# Altium footprint library My_Intlib.PcbLib: 224 footprints (part 9 of 14)
Each footprint in its own frame and in the unit in brackets; x right, y up, seen from the top. Pads: shape width x height; smd on the part's side, far side on the other; paste and mask are expansions set on the pad; w line width, h text height; cw(c..) or ccw(c..) is an arc to the next point about the centre after c.
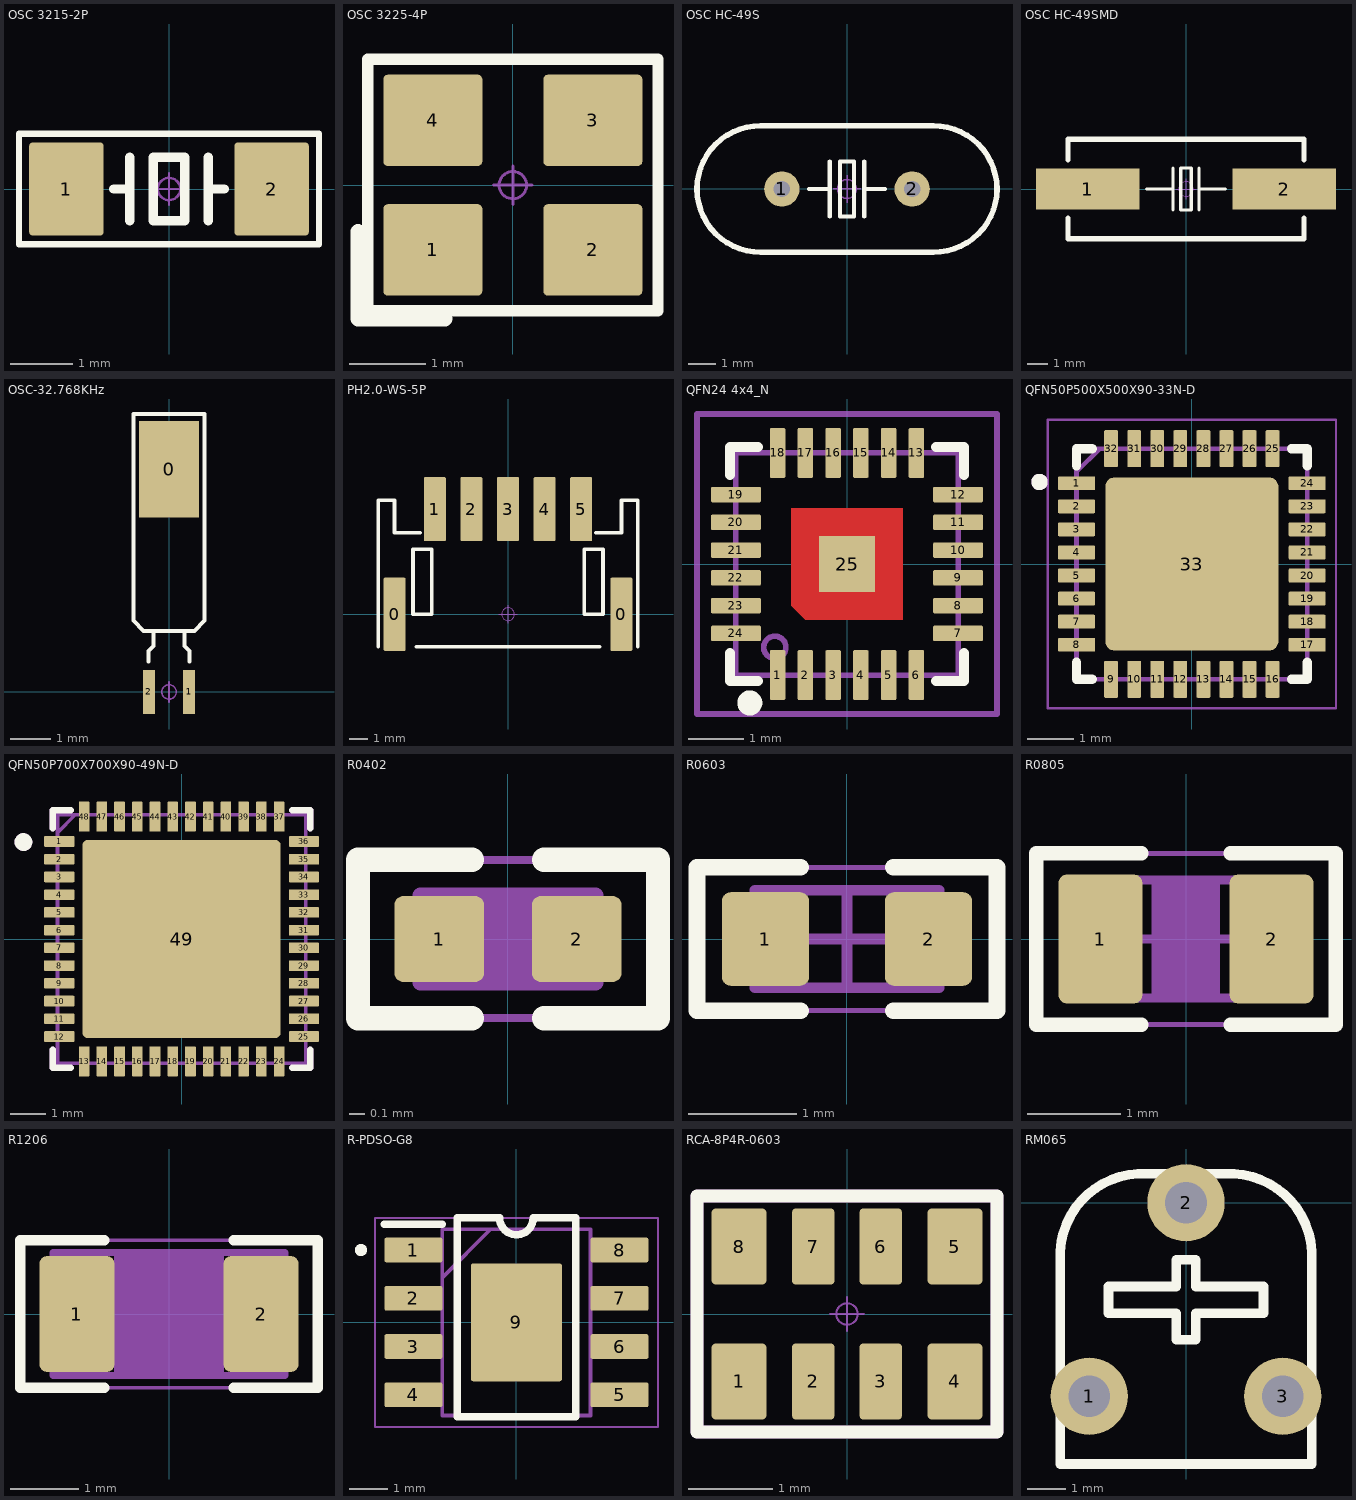
[diagram p8: the footprints below, top view; thin cyan lines are the x and y axes]

## OSC 3215-2P [mm] "3.2*1.5*0.6mm(长宽高)"
pads (2):
  rrect10% 1.2x1.5 smd: 1(-1.65,0) 2(1.65,0)
Top Overlay:
  lines w0.1: -2.413,-0.889 2.413,-0.889 2.413,0.889 -2.413,0.889 -2.413,-0.889
  lines w0.152: -0.889,0 -0.635,0 ; -0.635,-0.508 -0.635,0.508 ; 0.635,-0.508 0.635,0.508 ; 0.635,0 0.889,0 ; -0.254,-0.508 -0.254,0.508 0.254,0.508 0.254,-0.508 -0.254,-0.508
Top Value:
  text ".Comment" at -1.524,-2.414 h0.89
Top Assembly:
  text ".Designator" at -1.524,-1.621 h0.89
Mechanical 15:
  circle w0.04: c0,0 r0.18
  lines w0.04: -0.254,0 0.254,0 ; 0,-0.254 0,0.254
3D body "OSC 3215-2.STEP": height 0.61, standoff -0.01, extent -1.6,-0.75 1.6,0.75

## OSC 3225-4P [mm] "3.2*2.5*0.7mm(长宽高)"
pads (4):
  rrect10% 1.3x1.2 smd: 1(-1.05,-0.85) 2(1.05,-0.85) 3(1.05,0.85) 4(-1.05,0.85)
Top Overlay:
  lines w0.15: -1.905,-1.651 1.905,-1.651 1.905,1.651 -1.905,1.651 -1.905,-1.651
  lines w0.2: -2.032,-1.753 -0.889,-1.753 ; -2.032,-1.727 -2.032,-0.61
Top Value:
  text ".Comment" at 2.134,-0.636 h0.89
Top Assembly:
  text ".Designator" at 2.134,0.157 h0.89
Mechanical 15:
  circle w0.04: c0,0 r0.18
  lines w0.04: -0.254,0 0.254,0 ; 0,-0.254 0,0.254
3D body "OSC 3225-4.STEP": height 0.7, standoff -0.02, extent -1.6,-1.25 1.6,1.25

## OSC HC-49S [mm]
pads (2):
  round 1.3 hole 0.6: 1(-2.4,0) 2(2.4,0)
Top Overlay:
  lines w0.152: -1.397,0 -0.635,0 ; -0.635,-1.016 -0.635,1.016 ; 0.635,-1.016 0.635,1.016 ; 0.635,0 1.397,0 ; -0.254,-1.016 -0.254,1.016 0.254,1.016 0.254,-1.016 -0.254,-1.016
  lines w0.203: -3.175,2.325 ccw(c-3.2,0) -3.173,-2.325 3.175,-2.325 ccw(c3.2,0) 3.173,2.325 -3.175,2.325
Top Value:
  text ".Comment" at -2.464,2.564 h0.89
Top Assembly:
  text ".Designator" at -2.464,3.358 h0.89
Mechanical 15:
  circle w0.05: c0,0 r0.35
  lines w0.05: -0.5,0 0.5,0 ; 0,-0.5 0,0.5
3D body "OSC HC-49S.STEP": height 4.13, standoff -3.45, extent -5.525,-2.325 5.525,2.325

## OSC HC-49SMD [mm]
pads (2):
  rect 5x2 smd: 1(-4.75,0) 2(4.75,0)
Top Overlay:
  lines w0.152: -1.905,0 -0.635,0 ; -0.635,-1.016 -0.635,1.016 ; 0.635,-1.016 0.635,1.016 ; 0.635,0 1.905,0 ; -0.254,-1.016 -0.254,1.016 0.254,1.016 0.254,-1.016 -0.254,-1.016
  lines w0.254: -5.7,-1.397 -5.7,-2.4 5.7,-2.4 5.7,-1.397 ; -5.7,1.397 -5.7,2.4 5.7,2.4 5.7,1.397
Top Value:
  text ".Comment" at -3.2,3.148 h0.89
Top Assembly:
  text ".Designator" at -3.2,3.942 h0.89
Mechanical 15:
  circle w0.05: c0,0 r0.35
  lines w0.05: -0.5,0 0.5,0 ; 0,-0.5 0,0.5
3D body "OSC HC-49SMD.STEP": height 4.63, standoff 0.03, extent -6.5,-2.325 6.5,2.325

## OSC-32.768KHz [mm] "脚距：1.0mm"
pads (3):
  rect 1.5x2.4 smd mask+0.076: 0(0,5.55)
  rect 0.3x1.1 smd: 1(0.5,0) 2(-0.5,0)
Top Overlay:
  lines w0.1: -0.508,0.762 -0.508,1.016 -0.381,1.143 -0.381,1.524 ; 0.381,1.524 0.381,1.143 0.508,1.016 0.508,0.762 ; -0.889,1.778 -0.635,1.524 0.635,1.524 0.889,1.778 0.889,6.929 -0.889,6.929 -0.889,1.778
Top Value:
  text ".Comment" at 1.118,3.555 h0.89
Top Assembly:
  text ".Designator" at 1.118,4.348 h0.89
Mechanical 15:
  circle w0.04: c0,0 r0.18
  lines w0.04: 0,-0.254 0,0.254
3D body "32.768KHz.STEP": height 1.49, standoff -0.01, extent -0.75,-0.381 0.75,6.819

## PH2.0-WS-5P [mm] "长：14mm，宽：7.6mm，高：5.5mm"
pads (7):
  rrect10% 1.2x4 smd: 0(-6.2,-0.006) 0(6.2,-0.006)
  rrect10% 1.2x3.5 smd: 1(-4,5.744) 2(-2,5.744) 3(0,5.744) 4(2,5.744) 5(4,5.744)
Top Overlay:
  lines w0.2: -7.096,-1.778 -7.096,6.223 -6.207,6.223 -6.207,4.445 -4.81,4.445 ; -5,-1.778 5,-1.778 ; 4.81,4.445 6.207,4.445 6.207,6.223 7.096,6.223 7.096,-1.778 ; -5.191,0 -5.191,3.556 -4.175,3.556 -4.175,0 -5.191,0 ; 4.175,0 4.175,3.556 5.191,3.556 5.191,0 4.175,0
Mechanical 15:
  circle w0.05: c0,0 r0.35
  lines w0.05: -0.5,0 0.5,0 ; 0,-0.5 0,0.5
3D body "PH2.0 SMD-W-5P.STEP": height 5.55, standoff 0.05, extent -7,-1.65 7,6.95

## QFN24 4x4_N [mm] "24脚，长x宽x高：4x4x1mm，脚距：0.5mm"
pads (25):
  rrect20% 0.28x0.9 smd: 1(-1.25,-2) 2(-0.75,-2) 3(-0.25,-2) 4(0.25,-2) 5(0.75,-2) 6(1.25,-2) 13(1.25,2) 14(0.75,2) 15(0.25,2) 16(-0.25,2) 17(-0.75,2) 18(-1.25,2)
  rrect20% 0.9x0.28 smd: 7(2,-1.25) 8(2,-0.75) 9(2,-0.25) 10(2,0.25) 11(2,0.75) 12(2,1.25) 19(-2,1.25) 20(-2,0.75) 21(-2,0.25) 22(-2,-0.25) 23(-2,-0.75) 24(-2,-1.25)
  rect 1x1 smd: 25(0,0)
Top Layer:
  region: -1,1 1,1 1,-1 -0.75,-1 -1,-0.75
Top Overlay:
  circle w0.25: c-1.75,-2.5 r0.1
  lines w0.178: -2.106,-1.6 -2.106,-2.106 -1.6,-2.106 ; -2.106,1.6 -2.106,2.106 -1.6,2.106 ; 1.6,-2.106 2.106,-2.106 2.106,-1.6 ; 1.6,2.106 2.106,2.106 2.106,1.6
Top Solder:
  region: -1,1 1,1 1,-1 -0.75,-1 -1,-0.75
Top Value:
  text ".Comment" at 2.515,-0.103 h0.89
Top Assembly:
  text ".Designator" at 2.515,0.691 h0.89
Mechanical 13:
  circle w0.1: c-1.3,-1.5 r0.2
  lines w0.1: -2,-2 -2,2 2,2 2,-2 -2,-2
Mechanical 15:
  circle w0.05: c0,0 r0.35
  lines w0.05: -0.5,0 0.5,0 ; 0,-0.5 0,0.5
  lines w0.1: -2.7,-2.7 2.7,-2.7 2.7,2.7 -2.7,2.7 -2.7,-2.7
3D body "QFN24-4X4.STEP": height 0.95, standoff -0.05, extent -2.01,-2.01 2.01,2.01

## QFN50P500X500X90-33N-D [mm]
pads (33):
  rrect15% 0.8x0.3 smd: 1(-2.5,1.75) 2(-2.5,1.25) 3(-2.5,0.75) 4(-2.5,0.25) 5(-2.5,-0.25) 6(-2.5,-0.75) 7(-2.5,-1.25) 8(-2.5,-1.75) 17(2.5,-1.75) 18(2.5,-1.25) 19(2.5,-0.75) 20(2.5,-0.25) 21(2.5,0.25) 22(2.5,0.75) 23(2.5,1.25) 24(2.5,1.75)
  rrect15% 0.3x0.8 smd: 9(-1.75,-2.5) 10(-1.25,-2.5) 11(-0.75,-2.5) 12(-0.25,-2.5) 13(0.25,-2.5) 14(0.75,-2.5) 15(1.25,-2.5) 16(1.75,-2.5) 25(1.75,2.5) 26(1.25,2.5) 27(0.75,2.5) 28(0.25,2.5) 29(-0.25,2.5) 30(-0.75,2.5) 31(-1.25,2.5) 32(-1.75,2.5)
  rrect10% 3.75x3.75 smd: 33(0,0)
Top Overlay:
  circle w0.203: c-3.302,1.778 r0.076
  lines w0.203: -2.5,-2.13 -2.5,-2.5 -2.16,-2.5 ; 2.16,-2.5 2.5,-2.5 2.5,-2.13 ; 2.16,2.5 2.5,2.5 2.5,2.13 ; -2.5,2.5 -2.16,2.5 -2.5,2.5 ; -2.5,2.5 -2.5,2.13 -2.5,2.5
Top Value:
  text ".Comment" at 3.835,1.066 h0.89
Top Assembly:
  circle w0.203: c-3.302,1.778 r0.076
  lines w0.1: -2.5,2 -2,2.5 ; -2.5,-2.5 -2.5,2.5 2.5,2.5 2.5,-2.5 -2.5,-2.5
  text ".Designator" at 3.835,1.859 h0.89
Mechanical 13:
  lines w0.1: -2.5,2 -2,2.5 ; -2.5,-2.5 -2.5,2.5 2.5,2.5 2.5,-2.5 -2.5,-2.5
Mechanical 15:
  lines w0.05: -3.125,-3.125 -3.125,3.125 3.125,3.125 3.125,-3.125 -3.125,-3.125
3D body "ESP8266EX.stp": height 0.9, standoff 0, extent -2.55,-2.55 2.55,2.55

## QFN50P700X700X90-49N-D [mm]
pads (49):
  rrect15% 0.85x0.3 smd: 1(-3.45,2.75) 2(-3.45,2.25) 3(-3.45,1.75) 4(-3.45,1.25) 5(-3.45,0.75) 6(-3.45,0.25) 7(-3.45,-0.25) 8(-3.45,-0.75) 9(-3.45,-1.25) 10(-3.45,-1.75) 11(-3.45,-2.25) 12(-3.45,-2.75) 25(3.45,-2.75) 26(3.45,-2.25) 27(3.45,-1.75) 28(3.45,-1.25) 29(3.45,-0.75) 30(3.45,-0.25) 31(3.45,0.25) 32(3.45,0.75) 33(3.45,1.25) 34(3.45,1.75) 35(3.45,2.25) 36(3.45,2.75)
  rrect15% 0.3x0.85 smd: 13(-2.75,-3.45) 14(-2.25,-3.45) 15(-1.75,-3.45) 16(-1.25,-3.45) 17(-0.75,-3.45) 18(-0.25,-3.45) 19(0.25,-3.45) 20(0.75,-3.45) 21(1.25,-3.45) 22(1.75,-3.45) 23(2.25,-3.45) 24(2.75,-3.45) 37(2.75,3.45) 38(2.25,3.45) 39(1.75,3.45) 40(1.25,3.45) 41(0.75,3.45) 42(0.25,3.45) 43(-0.25,3.45) 44(-0.75,3.45) 45(-1.25,3.45) 46(-1.75,3.45) 47(-2.25,3.45) 48(-2.75,3.45)
  rrect5% 5.588x5.588 smd: 49(0,0)
Top Overlay:
  circle w0.25: c-4.46,2.734 r0.125
  lines w0.178: -3.63,-3.124 -3.63,-3.63 -3.124,-3.63 ; -3.63,3.124 -3.63,3.63 -3.124,3.63 ; 3.124,-3.63 3.63,-3.63 3.63,-3.124 ; 3.124,3.63 3.63,3.63 3.63,3.124
Top Value:
  text ".Comment" at 4.216,0.735 h0.89
Top Assembly:
  circle w0.25: c-4.46,2.734 r0.125
  lines w0.178: -3.63,-3.124 -3.63,-3.63 -3.124,-3.63 ; -3.63,3.124 -3.63,3.63 -3.124,3.63 ; 3.124,-3.63 3.63,-3.63 3.63,-3.124 ; 3.124,3.63 3.63,3.63 3.63,3.124
  text ".Designator" at 4.216,1.529 h0.89
Mechanical 13:
  lines w0.1: -3.5,3 -3,3.5 ; -3.5,-3.5 -3.5,3.5 3.5,3.5 3.5,-3.5 -3.5,-3.5
3D body "LD3320.stp": height 0.9, standoff 0, extent -3.55,-3.55 3.55,3.55

## R0402 [mm]
pads (2):
  rrect20% 0.566x0.54 smd mask+0.051: 1(-0.433,0) 2(0.433,0)
Top Overlay:
  lines w0.152: -0.226,-0.499 -0.944,-0.499 -0.944,0.499 -0.226,0.499 ; 0.226,-0.499 0.944,-0.499 0.944,0.499 0.226,0.499
Mechanical 1:
  pour cut-out: -0.15,0.275 0.15,0.275 0.15,-0.275 -0.15,-0.275
  pour cut-out: -0.15,0.275 0.15,0.275 0.15,-0.275 -0.15,-0.275
Top Value:
  text ".Comment" at -0.55,-1.008 h0.76
Top Assembly:
  lines w0.1: -0.55,-0.275 -0.55,0.275 0.55,0.275 0.55,-0.275 -0.55,-0.275
  text ".Designator" at -0.55,-0.275 h0.76
Mechanical 15:
  lines w0.05: -0.944,-0.499 -0.944,0.499 0.944,0.499 0.944,-0.499 -0.944,-0.499
  lines w0.1: -0.275,0 0.275,0 ; 0,-0.275 0,0.275
3D body "R0402.stp": height 0.34, standoff -0.02, extent -0.515,-0.244 0.515,0.256

## R0603 [mm]
pads (2):
  rrect20% 0.806x0.864 smd: 1(-0.753,0) 2(0.753,0)
Top Overlay:
  lines w0.152: -0.426,-0.661 -1.385,-0.661 -1.385,0.661 -0.426,0.661 ; 0.426,-0.661 1.385,-0.661 1.385,0.661 0.426,0.661
Top Value:
  text ".Comment" at -0.711,-1.245 h0.89
Top Assembly:
  lines w0.1: -0.85,-0.45 0.85,-0.45 0.85,0.45 -0.85,0.45 -0.85,-0.45
  text ".Designator" at -0.711,-0.279 h0.89
Mechanical 15:
  lines w0.05: -1.385,-0.661 1.385,-0.661 1.385,0.661 -1.385,0.661 -1.385,-0.661
  lines w0.1: -0.45,0 0.45,0 ; 0,-0.45 0,0.45
3D body "User Library-RES_1609-0603.STEP": height 0.56, standoff 0, extent -0.85,-0.406 0.85,0.394

## R0805 [mm]
pads (2):
  rrect20% 0.9x1.377 smd: 1(-0.915,0) 2(0.915,0)
Top Overlay:
  lines w0.152: -0.476,-0.917 -1.6,-0.917 -1.6,0.917 -0.476,0.917 ; 0.476,-0.917 1.6,-0.917 1.6,0.917 0.476,0.917
Mechanical 1:
  pour cut-out: -0.366,0.63 0.362,0.63 0.362,-0.63 -0.366,-0.63
Top Value:
  text ".Comment" at -0.914,-1.17 h0.89
Top Assembly:
  lines w0.1: -1.1,-0.63 1.1,-0.63 1.1,0.63 -1.1,0.63 -1.1,-0.63
  text ".Designator" at -0.915,-0.275 h0.89
Mechanical 15:
  lines w0.05: -1.6,-0.914 1.6,-0.914 1.6,0.914 -1.6,0.914 -1.6,-0.914
  lines w0.1: -0.5,0 0.5,0 ; 0,-0.5 0,0.5
3D body "User Library-R_0805.STEP": height 0.49, standoff -0.01, extent -0.997,-0.625 1.003,0.625

## R1206 [mm]
pads (2):
  rrect20% 1.1x1.7 smd: 1(-1.35,0) 2(1.35,0)
Top Overlay:
  lines w0.152: -0.951,-1.079 -2.184,-1.079 -2.184,1.079 -0.951,1.079 ; 0.951,-1.079 2.184,-1.079 2.184,1.079 0.951,1.079
Mechanical 1:
  pour cut-out: -0.8,0.9 0.8,0.9 0.8,-0.9 -0.8,-0.9
Top Value:
  text ".Comment" at -1.422,-0.991 h0.89
Top Assembly:
  lines w0.1: -1.7,-0.9 1.7,-0.9 1.7,0.9 -1.7,0.9 -1.7,-0.9
  text ".Designator" at -1.422,-0.178 h0.89
Mechanical 15:
  lines w0.05: -2.184,-1.079 -2.184,1.079 2.184,1.079 2.184,-1.079 -2.184,-1.079
  lines w0.1: -0.5,0 0.5,0 ; 0,-0.5 0,0.5
3D body "User Library-RES_3216-1206.STEP": height 0.85, standoff 0, extent -1.7,-0.864 1.65,0.866

## R-PDSO-G8 [mm]
pads (9):
  rrect15% 1.525x0.65 smd: 1(-2.712,1.905) 2(-2.712,0.635) 3(-2.712,-0.635) 4(-2.712,-1.905) 5(2.712,-1.905) 6(2.712,-0.635) 7(2.712,0.635) 8(2.712,1.905)
  rrect5% 2.4x3.1 smd: 9(0,0)
Top Overlay:
  circle w0.16: c-4.089,1.905 r0.08
  lines w0.2: -3.475,2.58 -1.95,2.58 ; -1.56,-2.482 -1.56,2.75 -0.442,2.75 ccw(c0,2.75) 0.442,2.75 1.56,2.75 1.56,-2.482 -1.56,-2.482
Mechanical 13:
  lines w0.1: -1.95,1.18 -0.68,2.45 ; -1.95,-2.45 1.95,-2.45 1.95,2.45 -1.95,2.45 -1.95,-2.45
Mechanical 15:
  lines w0.05: -3.725,-2.75 3.725,-2.75 3.725,2.75 -3.725,2.75 -3.725,-2.75
3D body "LMR16020PDDAR.stp": height 1.57, standoff 0, extent -3,-2.45 3,2.45

## RCA-8P4R-0603 [mm] "3.2mm*1.6mm*0.6mm(长*宽*厚)"
pads (8):
  rrect15% 0.65x0.9 smd: 1(-1.28,-0.8) 4(1.28,-0.8) 5(1.28,0.8) 8(-1.28,0.8)
  rrect15% 0.5x0.9 smd: 2(-0.4,-0.8) 3(0.4,-0.8) 6(0.4,0.8) 7(-0.4,0.8)
Top Overlay:
  lines w0.152: -1.778,-1.397 1.778,-1.397 1.778,1.397 -1.778,1.397 -1.778,-1.397
Top Value:
  text ".Comment" at 1.88,-0.052 h0.89
Top Assembly:
  lines w0.152: -1.778,-1.397 1.778,-1.397 1.778,1.397 -1.778,1.397 -1.778,-1.397
  text ".Designator" at 1.88,0.741 h0.89
Mechanical 15:
  circle w0.025: c0,0 r0.127
  lines w0.025: -0.2,0 0.2,0 ; 0,-0.2 0,0.2
3D body "RCA-8P4R-0603.STEP": height 0.6, standoff 0, extent -1.6,-0.8 1.6,0.8

## RM065 [mil]
pads (3):
  round 80 hole 43.31: 1(-100,-200) 2(0,0) 3(100,-200)
Top Overlay:
  lines w10: -130,-270 -130,-50 cw(c-45,-55) -40,30 40,30 cw(c45,-55) 130,-50 130,-270 -130,-270 ; -80,-114.17 -10,-114.17 -10,-141.73 10,-141.73 10,-114.17 80,-114.17 80,-86.61 10,-86.61 10,-59.06 -10,-59.06 -10,-70 -10,-86.61 -80,-86.61 -80,-114.17
Top Value:
  text ".Comment" at 149,-106.05 h35
Top Assembly:
  text ".Designator" at 149,-74.81 h35
3D body "RM065.STEP": height 299.21, standoff -137.8, extent -127.95,-268.83 127.96,29.59